# Altium footprint library adafruit.PCBLIB: 648 footprints (part 37 of 41)
Each footprint in its own frame and in the unit in brackets; x right, y up, seen from the top. Pads: shape width x height; smd on the part's side, far side on the other; paste and mask are expansions set on the pad; w line width, h text height; cw(c..) or ccw(c..) is an arc to the next point about the centre after c.
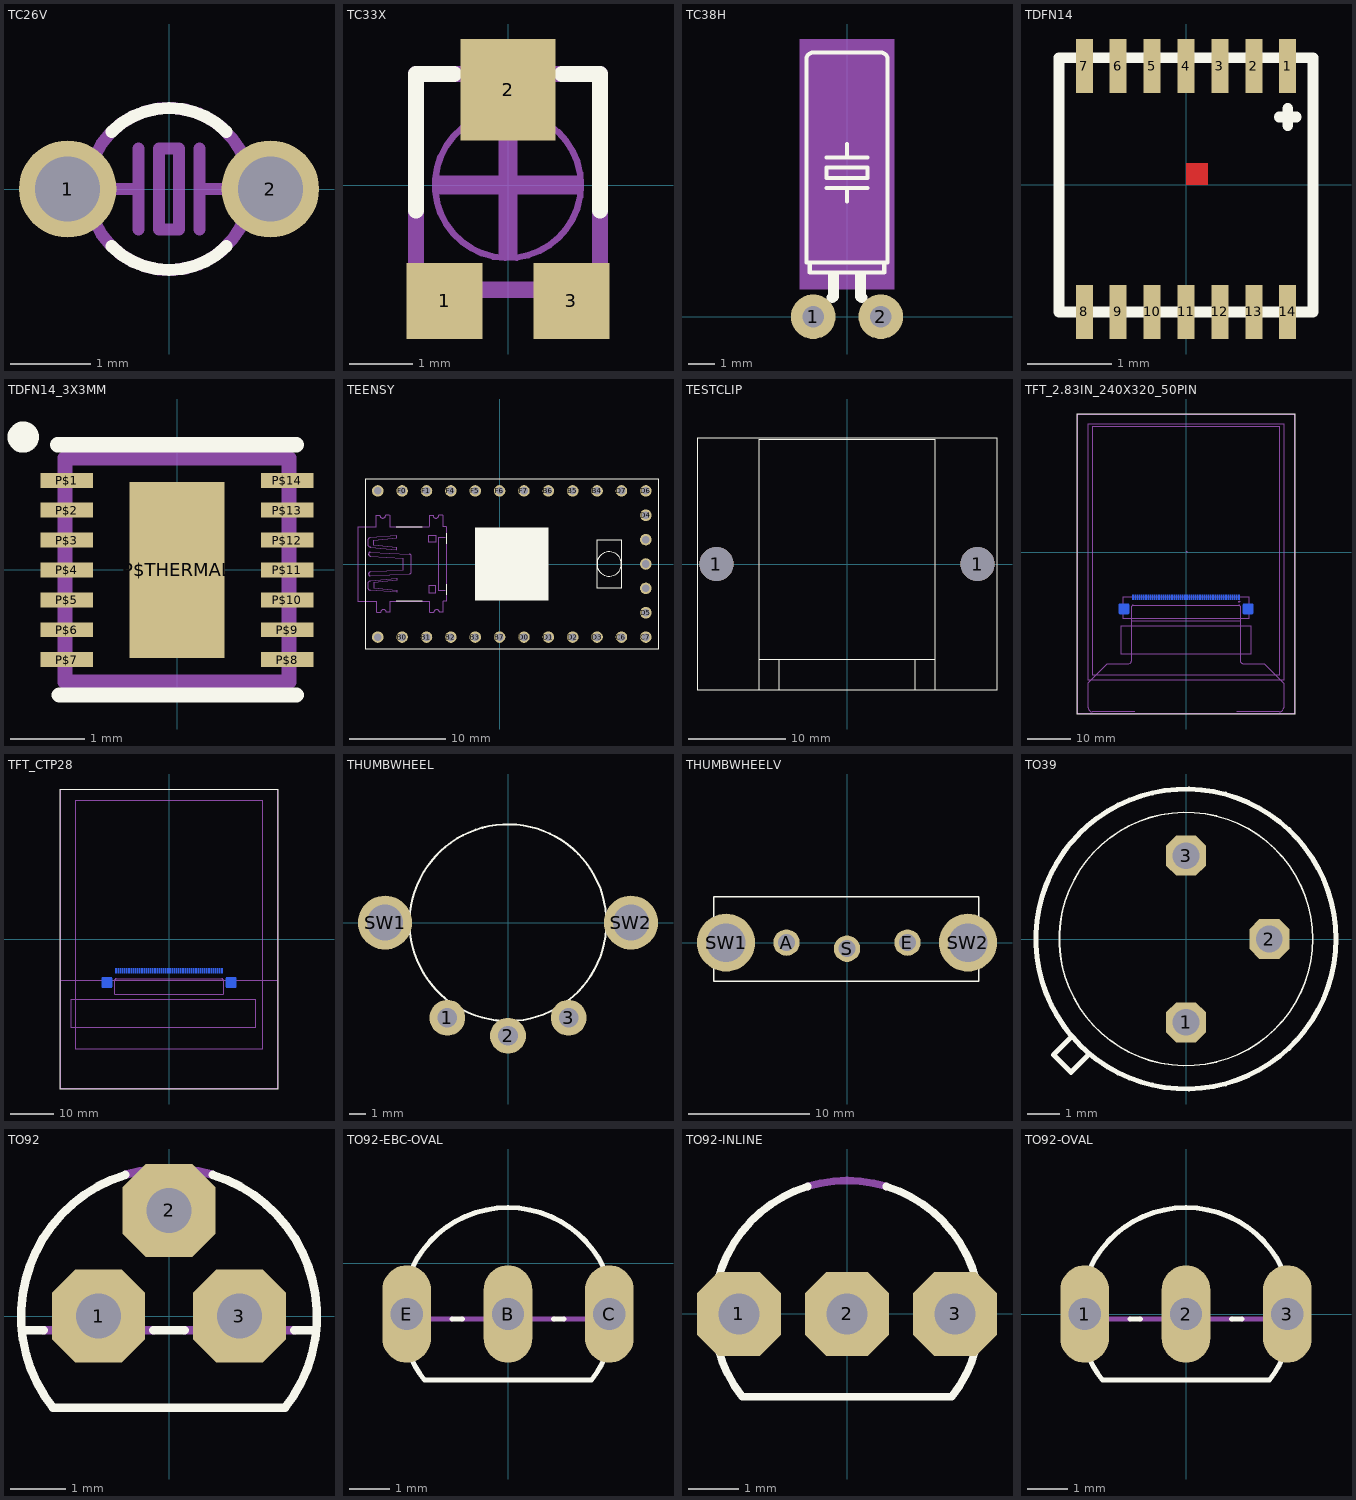
[diagram p36: the footprints below, top view; thin cyan lines are the x and y axes]

## TC26V [mil]
pads (2):
  round 48 hole 32: 1(-50,0) 2(50,0)
Top Overlay:
  lines w6: -28.28,-28.28 ccw(c0.01,0) 0,-40 ccw(c-0.01,0) 28.28,-28.28 ; -28.28,28.28 cw(c0.01,0) 0,40 cw(c-0.01,0) 28.28,28.28
Mechanical 16:
  circle w6: c0,0 r40
  lines w6: -30,0 -15,0 ; -15,-20 -15,0 ; -15,20 -15,0 ; 15,-20 15,0 ; 15,20 15,0 ; 30,0 15,0 ; -5,-20 5,-20 5,20 -5,20 -5,-20

## TC33X [mm]
pads (3):
  rect 1.2x1.2 smd: 1(-1,-1.825) 3(1,-1.825)
  rect 1.5x1.6 smd: 2(0,1.5)
Top Overlay:
  lines w0.254: -1.45,-0.4 -1.45,1.75 -0.85,1.75 ; 0.85,1.75 1.45,1.75 1.45,-0.4
Mechanical 16:
  circle w0.102: c0,0 r1.15
  rectangle: -1.15,-0.15 1.15,0.15
  rectangle: -0.15,-1.15 0.15,1.15
  lines w0.254: -1.45,-1.65 -1.45,1.75 1.45,1.75 1.45,-1.65 -1.45,-1.65

## TC38H [mil]
pads (2):
  round 66 hole 32: 1(-50,0) 2(50,0)
Top Overlay:
  rectangle: 12,40 28,63
  rectangle: -28,40 -12,63
  lines w6: -30,190 0,190 ; -30,235 0,235 ; 0,170 0,190 ; 0,255 0,235 ; 30,190 0,190 ; 30,235 0,235 ; -55,80 -55,65 55,65 55,80 ; -55,80 -60,80 -60,380 cw(c-50,380) -50,390 50,390 cw(c50,380) 60,380 60,80 55,80 ; -55,80 55,80 ; -30,205 -30,220 30,220 30,205 -30,205
  lines w16: -22,28 -20,30 -20,40 ; 20,45 20,30 22,28
Mechanical 10:
  rectangle: -70,40 70,410
Mechanical 16:
  lines w6: -50,0 -25,25 ; 25,25 50,0

## TDFN14 [mil]
pads (14):
  rect 7.87x25.2 smd: 1(47.24,55.12) 2(31.5,55.12) 3(15.75,55.12) 4(0,55.12) 5(-15.75,55.12) 6(-31.5,55.12) 7(-47.24,55.12) 8(-47.24,-59.06) 9(-31.5,-59.06) 10(-15.75,-59.06) 11(0,-59.06) 12(15.75,-59.06) 13(31.5,-59.06) 14(47.24,-59.06)
Top Layer:
  region: 0,0 10,0 10,10 0,10
Top Overlay:
  lines w5: 43.31,31.5 51.18,31.5 ; 47.24,27.56 47.24,35.43 ; -59.06,-59.06 59.06,-59.06 59.06,59.06 -59.06,59.06 -59.06,-59.06
Top Paste:
  region: 0,0 10,0 10,10 0,10
  region: 0,0 10,0 10,10 0,10
  region: 0,0 10,0 10,10 0,10
  region: 0,0 10,0 10,10 0,10
  region: 0,0 10,0 10,10 0,10
  region: 0,0 10,0 10,10 0,10
  region: 0,0 10,0 10,10 0,10
  region: 0,0 10,0 10,10 0,10
Top Solder:
  region: 0,0 10,0 10,10 0,10

## TDFN14_3X3MM [mil]
pads (15):
  rect 27.56x7.87 smd: P$1(-58.07,47.24) P$2(-58.07,31.5) P$3(-58.07,15.75) P$4(-58.07,0) P$5(-58.07,-15.75) P$6(-58.07,-31.5) P$7(-58.07,-47.24) P$8(58.07,-47.24) P$9(58.07,-31.5) P$10(58.07,-15.75) P$11(58.07,0) P$12(58.07,15.75) P$13(58.07,31.5) P$14(58.07,47.24)
  rect 50x92.52 smd: P$THERMAL(0,0)
Top Overlay:
  circle w12: c-81,70 r2.24
  lines w8: -62.99,65.94 62.99,65.94 ; -62.01,-65.94 62.99,-65.94
Top Paste:
  region: 71.85,-43.31 44.29,-43.31 44.29,-51.18 71.85,-51.18
  region: 71.85,-27.56 44.29,-27.56 44.29,-35.43 71.85,-35.43
  region: 71.85,-11.81 44.29,-11.81 44.29,-19.69 71.85,-19.69
  region: 71.85,3.94 44.29,3.94 44.29,-3.94 71.85,-3.94
  region: 71.85,19.69 44.29,19.69 44.29,11.81 71.85,11.81
  region: 71.85,35.43 44.29,35.43 44.29,27.56 71.85,27.56
  region: 71.85,51.18 44.29,51.18 44.29,43.31 71.85,43.31
  rectangle: -71.85,-51.18 -44.29,-43.31
  rectangle: -71.85,-35.43 -44.29,-27.56
  rectangle: -71.85,-19.69 -44.29,-11.81
  rectangle: -71.85,-3.94 -44.29,3.94
  rectangle: -71.85,11.81 -44.29,19.69
  rectangle: -71.85,27.56 -44.29,35.43
  rectangle: -71.85,43.31 -44.29,51.18
  rectangle: 3.94,-39.37 19.69,-7.87
  rectangle: -19.69,-39.37 -3.94,-7.87
  rectangle: 3.94,7.87 19.69,39.37
  rectangle: -19.69,7.87 -3.94,39.37
Top Solder:
  rectangle: 41.34,-54.13 74.8,54.13
  rectangle: -74.8,-54.13 -41.34,54.13
Mechanical 16:
  lines w8: -59.06,-59.06 -59.06,59.06 59.06,59.06 59.06,-59.06 -59.06,-59.06

## TEENSY [mil]
pads (29):
  round 47.25 hole 31.5: B0(-400,-300) B1(-300,-300) B2(-200,-300) B3(-100,-300) B4(400,300) B5(300,300) B6(200,300) B7(0,-300) C6(500,-300) C7(600,-300) D0(100,-300) D1(200,-300) D2(300,-300) D3(400,-300) D4(600,200) D5(600,-200) D6(600,300) D7(500,300) F0(-400,300) F1(-300,300) F4(-200,300) F5(-100,300) F6(0,300) F7(100,300) GND(-500,-300) GND2(600,0) RST(600,100) VCC(600,-100) VCC1(-500,300)
Top Overlay:
  circle w5: c450,0 r50
  rectangle: -100,-150 200,150
  lines w4: -538.04,40.87 -538.04,40.88
  lines w5: -423.62,-153.54 -317.32,-153.54 ; -423.62,153.54 -317.32,153.54 ; -218.9,-125.98 -218.9,-82.68 ; -218.9,82.68 -218.9,125.98 ; -550,-350 650,-350 650,350 -550,350 -550,-350 ; 400,-100 500,-100 500,100 400,100 400,-100
Mechanical 16:
  lines w4: -538.04,40.87 ccw(c-529.87,40.88) -529.86,32.7 -394.97,24.53 -394.97,-24.52 -529.86,-32.69 ccw(c-529.86,-40.87) -538.04,-40.87 ccw(c-529.87,-40.87) -529.86,-49.04 -370.44,-40.87 ccw(c-370.92,-32.22) -362.27,-32.69 -362.27,32.7 ccw(c-370.92,32.23) -370.44,40.88 -529.86,49.05 ccw(c-529.87,40.88) -538.04,40.88 ; -505.49,153.94 -505.49,199.21 ; -505.12,200 -491.34,200 ccw(c-479.53,200) -467.72,200 -451.97,200 ; -504.69,-198.03 -504.69,-152.76 ; -503.94,-198.82 -488.19,-198.82 cw(c-476.38,-198.82) -464.57,-198.82 -450.79,-198.82 ; -451.21,153.94 -451.21,199.21 ; -450.42,-198.03 -450.42,-152.76 ; -287.38,153.94 -287.38,199.21 ; -287.01,200 -273.23,200 ccw(c-261.42,200) -249.61,200 -233.86,200 ; -286.58,-198.03 -286.58,-152.76 ; -285.83,-198.82 -270.08,-198.82 cw(c-258.27,-198.82) -246.46,-198.82 -232.68,-198.82 ; -233.1,153.94 -233.1,199.21 ; -232.31,-198.03 -232.31,-152.76 ; -222.83,-108.27 -252.36,-108.27 -252.36,108.27 -222.83,108.27 ; -540.08,-100.14 ccw(c-528.98,-96.74) -529.86,-108.32 -421.54,-116.49 -421.54,-108.32 -515.56,-98.1 -515.56,-77.66 -421.54,-67.44 -421.54,-59.26 -529.86,-69.48 ccw(c-528.98,-81.06) -540.08,-77.66 ccw(c-503.43,-88.9) -540.08,-100.14 ; -540.08,77.67 cw(c-503.43,88.91) -540.08,100.15 cw(c-528.99,96.75) -529.86,108.32 -421.54,116.5 -421.54,108.32 -515.56,98.11 -515.56,77.67 -421.54,67.45 -421.54,59.27 -529.86,69.49 cw(c-528.98,81.07) -540.08,77.67 ; -291.73,-118.11 -291.73,-88.58 -262.2,-88.58 -262.2,-118.11 -291.73,-118.11 ; -291.73,88.58 -262.2,88.58 -262.2,118.11 -291.73,118.11 -291.73,88.58
  lines w5: -581.1,-153.54 -506.3,-153.54 ; -581.1,153.54 -506.3,153.54 ; -450.79,153.54 -289.37,153.54 ; -448.82,-153.54 -287.4,-153.54 ; -232.68,153.54 -218.9,153.54 ; -230.71,-153.54 -218.9,-153.54
Mechanical 30:
  lines w5: -581.1,-153.54 -581.1,153.54 ; -218.9,-153.54 -218.9,153.54

## TESTCLIP [mil]
pads (2):
  round 137.8 hole 137.8: 1(-527.56,0) 1(527.56,0)
Top Overlay:
  lines w5: -354.33,-507.87 -606.3,-507.87 -606.3,507.87 606.3,507.87 606.3,-507.87 354.33,-507.87 ; -354.33,-507.87 -275.59,-507.87 ; -354.33,-507.87 -354.33,-385.83 ; -354.33,-385.83 -354.33,503.94 354.33,503.94 354.33,-385.83 ; -354.33,-385.83 -275.59,-385.83 ; -275.59,-507.87 275.59,-507.87 ; -275.59,-507.87 -275.59,-385.83 ; -275.59,-507.87 275.59,-507.87 ; -275.59,-385.83 275.59,-385.83 ; 275.59,-507.87 354.33,-507.87 ; 275.59,-507.87 275.59,-385.83 ; 275.59,-385.83 354.33,-385.83 ; 354.33,-507.87 354.33,-385.83

## TFT_2.83IN_240X320_50PIN [mm]
pads (52):
  rect 0.275x1.2 smd far side: 1(12.25,-10.39) 2(11.75,-10.39) 3(11.25,-10.39) 4(10.75,-10.39) 5(10.25,-10.39) 6(9.75,-10.39) 7(9.25,-10.39) 8(8.75,-10.39) 9(8.25,-10.39) 10(7.75,-10.39) 11(7.25,-10.39) 12(6.75,-10.39) 13(6.25,-10.39) 14(5.75,-10.39) 15(5.25,-10.39) 16(4.75,-10.39) 17(4.25,-10.39) 18(3.75,-10.39) 19(3.25,-10.39) 20(2.75,-10.39) 21(2.25,-10.39) 22(1.75,-10.39) 23(1.25,-10.39) 24(0.75,-10.39) 25(0.25,-10.39) 26(-0.25,-10.39) 27(-0.75,-10.39) 28(-1.25,-10.39) 29(-1.75,-10.39) 30(-2.25,-10.39) 31(-2.75,-10.39) 32(-3.25,-10.39) 33(-3.75,-10.39) 34(-4.25,-10.39) 35(-4.75,-10.39) 36(-5.25,-10.39) 37(-5.75,-10.39) 38(-6.25,-10.39) 39(-6.75,-10.39) 40(-7.25,-10.39) 41(-7.75,-10.39) 42(-8.25,-10.39) 43(-8.75,-10.39) 44(-9.25,-10.39) 45(-9.75,-10.39) 46(-10.25,-10.39) 47(-10.75,-10.39) 48(-11.25,-10.39) 49(-11.75,-10.39) 50(-12.25,-10.39)
  rrect25% 2.4x2.4 smd far side: PAD1(14.35,-13.09) PAD2(-14.35,-13.09)
Top Overlay:
  lines w0.127: -25.1,-37.4 25.1,-37.4 25.1,32 -25.1,32 -25.1,-37.4
Bottom Overlay:
  lines w0.127: -14.8,-14.59 -14.8,-15.49 14.8,-15.49 14.8,-14.59 ; -14.8,-11.59 -14.8,-10.29 -12.7,-10.29 ; 12.6,-10.29 14.8,-10.29 14.8,-11.59
Bottom Solder:
  rectangle: -12.4,-11.05 -12.1,-9.75
  rectangle: -11.9,-11.05 -11.6,-9.75
  rectangle: -11.4,-11.05 -11.1,-9.75
  rectangle: -10.4,-11.05 -10.1,-9.75
  rectangle: -10.9,-11.05 -10.6,-9.75
  rectangle: -9.9,-11.05 -9.6,-9.75
  rectangle: -9.4,-11.05 -9.1,-9.75
  rectangle: -8.9,-11.05 -8.6,-9.75
  rectangle: -8.4,-11.05 -8.1,-9.75
  rectangle: -7.4,-11.05 -7.1,-9.75
  rectangle: -7.9,-11.05 -7.6,-9.75
  rectangle: -6.9,-11.05 -6.6,-9.75
  rectangle: -6.4,-11.05 -6.1,-9.75
  rectangle: -5.9,-11.05 -5.6,-9.75
  rectangle: -5.4,-11.05 -5.1,-9.75
  rectangle: -4.4,-11.05 -4.1,-9.75
  rectangle: -4.9,-11.05 -4.6,-9.75
  rectangle: -3.9,-11.05 -3.6,-9.75
  rectangle: -3.4,-11.05 -3.1,-9.75
  rectangle: -2.9,-11.05 -2.6,-9.75
  rectangle: -2.4,-11.05 -2.1,-9.75
  rectangle: -1.4,-11.05 -1.1,-9.75
  rectangle: -1.9,-11.05 -1.6,-9.75
  rectangle: -0.9,-11.05 -0.6,-9.75
  rectangle: -0.4,-11.05 -0.1,-9.75
  rectangle: 0.1,-11.05 0.4,-9.75
  rectangle: 0.6,-11.05 0.9,-9.75
  rectangle: 1.6,-11.05 1.9,-9.75
  rectangle: 1.1,-11.05 1.4,-9.75
  rectangle: 2.1,-11.05 2.4,-9.75
  rectangle: 2.6,-11.05 2.9,-9.75
  rectangle: 3.1,-11.05 3.4,-9.75
  rectangle: 3.6,-11.05 3.9,-9.75
  rectangle: 4.6,-11.05 4.9,-9.75
  rectangle: 4.1,-11.05 4.4,-9.75
  rectangle: 5.1,-11.05 5.4,-9.75
  rectangle: 5.6,-11.05 5.9,-9.75
  rectangle: 6.1,-11.05 6.4,-9.75
  rectangle: 6.6,-11.05 6.9,-9.75
  rectangle: 7.6,-11.05 7.9,-9.75
  rectangle: 7.1,-11.05 7.4,-9.75
  rectangle: 8.1,-11.05 8.4,-9.75
  rectangle: 8.6,-11.05 8.9,-9.75
  rectangle: 9.1,-11.05 9.4,-9.75
  rectangle: 9.6,-11.05 9.9,-9.75
  rectangle: 10.6,-11.05 10.9,-9.75
  rectangle: 10.1,-11.05 10.4,-9.75
  rectangle: 11.1,-11.05 11.4,-9.75
  rectangle: 11.6,-11.05 11.9,-9.75
  rectangle: 12.1,-11.05 12.4,-9.75
Mechanical 11:
  region: 0,0 0.254,0 0.254,0.254 0,0.254
Mechanical 16:
  lines w0.127: -11.8,-36.9 -12.1,-36.9 -21.7,-36.9 cw(c-21.7,-36) -22.6,-36 -22.6,-30.2 -18.2,-25.8 -13.5,-25.8 ccw(c-13.5,-24.8) -12.5,-24.8 -12.5,-15.8 ; 11.7,-36.9 21.6,-36.9 ccw(c21.6,-35.9) 22.6,-35.9 22.6,-30.3 18.1,-25.8 17.9,-25.8 13.4,-25.8 cw(c13.4,-24.9) 12.5,-24.9 12.5,-15.8 ; -12.5,-15.8 -12.5,-12.5 cw(c-12.2,-12.5) -12.2,-12.2 12.2,-12.2 cw(c12.2,-12.5) 12.5,-12.5 12.5,-15.8 ; -12.5,-15.8 12.5,-15.8 ; -25,-37.3 25,-37.3 25,31.9 -25,31.9 -25,-37.3 ; -22.6,-29.55 22.6,-29.55 22.6,29.8 -22.6,29.8 -22.6,-29.55 ; -21.6,-28.38 21.6,-28.38 21.6,29.22 -21.6,29.22 -21.6,-28.38 ; -15,-23.54 15,-23.54 15,-17 -15,-17 -15,-23.54
  text "2.83\" 240x320" at 0,1.2 h1.97
  text "TFT LCD Display" at 0,-1.5 h1.97
  text "50" at -11.2,-16.7 h0.86
  text "1" at 11.6,-16.7 h0.86
  text "XL" at -19.5,0 h1.42
  text "XR" at 19.5,0 h1.42
  text "YU" at 0,27.5 h1.42
  text "YD" at 0,-27 h1.42
  text "Suggested Cutout Zone" at 0,-22.5 h1.26
  text "Captouch chip" at 8.89,-33.02 h1.97
Mechanical 30:
  lines w0.127: 12.3,-11.39 12.4,-11.49 ; 12.4,-11.49 12.1,-11.49 12.3,-11.29 12.5,-11.49 12.4,-11.49 ; -14.65,-15.39 -14.65,-10.39 14.65,-10.39 14.65,-15.39 -14.65,-15.39

## TFT_CTP28 [mm]
pads (52):
  rect 0.275x1.2 smd far side: 1(12.25,-7.36) 2(11.75,-7.36) 3(11.25,-7.36) 4(10.75,-7.36) 5(10.25,-7.36) 6(9.75,-7.36) 7(9.25,-7.36) 8(8.75,-7.36) 9(8.25,-7.36) 10(7.75,-7.36) 11(7.25,-7.36) 12(6.75,-7.36) 13(6.25,-7.36) 14(5.75,-7.36) 15(5.25,-7.36) 16(4.75,-7.36) 17(4.25,-7.36) 18(3.75,-7.36) 19(3.25,-7.36) 20(2.75,-7.36) 21(2.25,-7.36) 22(1.75,-7.36) 23(1.25,-7.36) 24(0.75,-7.36) 25(0.25,-7.36) 26(-0.25,-7.36) 27(-0.75,-7.36) 28(-1.25,-7.36) 29(-1.75,-7.36) 30(-2.25,-7.36) 31(-2.75,-7.36) 32(-3.25,-7.36) 33(-3.75,-7.36) 34(-4.25,-7.36) 35(-4.75,-7.36) 36(-5.25,-7.36) 37(-5.75,-7.36) 38(-6.25,-7.36) 39(-6.75,-7.36) 40(-7.25,-7.36) 41(-7.75,-7.36) 42(-8.25,-7.36) 43(-8.75,-7.36) 44(-9.25,-7.36) 45(-9.75,-7.36) 46(-10.25,-7.36) 47(-10.75,-7.36) 48(-11.25,-7.36) 49(-11.75,-7.36) 50(-12.25,-7.36)
  rrect25% 2.4x2.4 smd far side: PAD1(14.35,-10.06) PAD2(-14.35,-10.06)
Top Overlay:
  lines w0.127: -25.1,-34.7 25.1,-34.7 25.1,34.7 -25.1,34.7 -25.1,-34.7
Bottom Overlay:
  region: 0,0 0.254,0 0.254,0.254 0,0.254
  lines w0.127: -14.8,-11.56 -14.8,-12.46 14.8,-12.46 14.8,-11.56 ; -14.8,-8.56 -14.8,-7.26 -12.7,-7.26 ; 12.6,-7.26 14.8,-7.26 14.8,-8.56
Mechanical 16:
  lines w0.127: -25,-9.6 -25,-34.6 25,-34.6 25,-9.6 ; -25,-9.6 -25,34.6 25,34.6 25,-9.6 ; -25,-9.6 25,-9.6 ; -22.62,-20.51 20,-20.51 20,-13.97 -22.62,-13.97 -22.62,-20.51 ; -21.6,-25.5 21.6,-25.5 21.6,32.1 -21.6,32.1 -21.6,-25.5 ; -12.5,-12.77 -12.5,-9.47 cw(c-12.2,-9.47) -12.2,-9.17 12.2,-9.17 cw(c12.2,-9.47) 12.5,-9.47 12.5,-12.77 -12.5,-12.77
  text "2.83\"" at 0,28.998 h2.6
  text "240x320 Display" at 0,26.4 h2.6
  text "Capacitive Touch Panel" at 0,21 h2.6
  text "50" at -11.2,-13.67 h0.86
  text "1" at 11.6,-13.67 h0.86
  text "Suggested Cutout Zone" at 0,-19.47 h1.26

## THUMBWHEEL [mil]
pads (5):
  round 86 hole 47.24: 1(-145.67,-228.35) 2(0,-271.65) 3(145.67,-228.35)
  round 129.91 hole 86.61: SW1(-295.28,0) SW2(295.28,0)
Top Overlay:
  circle w5: c0,0 r236.22

## THUMBWHEELV [mil]
pads (5):
  round 86 hole 55.12: A(-196.85,0) E(196.85,0) S(0,-19.69)
  round 188.97 hole 125.98: SW1(-393.7,0) SW2(393.7,0)
Top Overlay:
  lines w5: -433.07,-125.98 -433.07,149.61 429.13,149.61 429.13,-125.98 -433.07,-125.98

## TO39 [mil]
pads (3):
  oct 48x48 hole 32: 1(0,-100) 2(100,0) 3(0,100)
Top Overlay:
  circle w6: c0,0 r180
  circle w2: c0,0 r152
  lines w6: -138,-118 -159,-139 -138,-160 -117,-139

## TO92 [mil]
pads (3):
  oct 66x66 hole 32: 1(-50,0) 2(0,75) 3(50,0)
Top Overlay:
  lines w6: -104.53,-10 -88.74,-10 ; -30.98,100.33 ccw(c-0.02,0) -82.48,-65 82.48,-65 ccw(c0.02,0) 30.98,100.33 ; -11.26,-10 11.26,-10 ; 88.74,-10 104.53,-10
Mechanical 16:
  lines w6: -88.74,-10 -11.26,-10 ; -30.96,100.33 cw(c0,0) 30.96,100.33 ; 11.26,-10 88.74,-10

## TO92-EBC-OVAL [mil]
pads (3):
  oval 48x96 hole 32: B(0,-50) C(100,-50) E(-100,-50)
Top Overlay:
  lines w5: -95.02,-94.72 ccw(c-0.02,-49.99) -82.48,-115 82.48,-115 ccw(c0.01,-50) 95.46,-93.77 ; -95,-5.28 cw(c0,-50) 95,-5.28 ; -55.28,-55 -44.72,-55 ; 44.72,-55 55.28,-55
Mechanical 16:
  lines w5: -104.88,-55 -55.28,-55 ; -95,-94.72 cw(c0,-50) -95,-5.28 ; -44.72,-55 44.72,-55 ; 55.28,-55 104.88,-55 ; 95,-94.72 ccw(c0,-50) 95,-5.28

## TO92-INLINE [mil]
pads (3):
  oct 66x66 hole 32: 1(-85,0) 2(0,0) 3(85,0)
Top Overlay:
  lines w6: -104.53,-10 -88.74,-10 ; -82.48,-65 82.48,-65 ccw(c0.02,0) 30.98,100.33 ; -82.46,-65 cw(c0,0) -30.96,100.33 ; 88.74,-10 104.53,-10
Mechanical 16:
  lines w6: -30.96,100.33 cw(c0,-0.02) 30.96,100.33

## TO92-OVAL [mil]
pads (3):
  oval 48x96 hole 32: 1(-100,0) 2(0,0) 3(100,0)
Top Overlay:
  lines w5: -95.02,-44.72 ccw(c-0.02,0.01) -82.48,-65 82.48,-65 ccw(c0.01,0) 95.46,-43.77 ; -95,44.72 cw(c0,0) 95,44.72 ; -55.28,-5 -44.72,-5 ; 44.72,-5 55.28,-5
Mechanical 16:
  lines w5: -104.88,-5 -55.28,-5 ; -95,-44.72 cw(c0,0) -95,44.72 ; -44.72,-5 44.72,-5 ; 55.28,-5 104.88,-5 ; 95,-44.72 ccw(c0,0) 95,44.72